# Altium footprint library biblioteka_pcb.PcbLib: 184 footprints (part 7 of 12)
Each footprint in its own frame and in the unit in brackets; x right, y up, seen from the top. Pads: shape width x height; smd on the part's side, far side on the other; paste and mask are expansions set on the pad; w line width, h text height; cw(c..) or ccw(c..) is an arc to the next point about the centre after c.
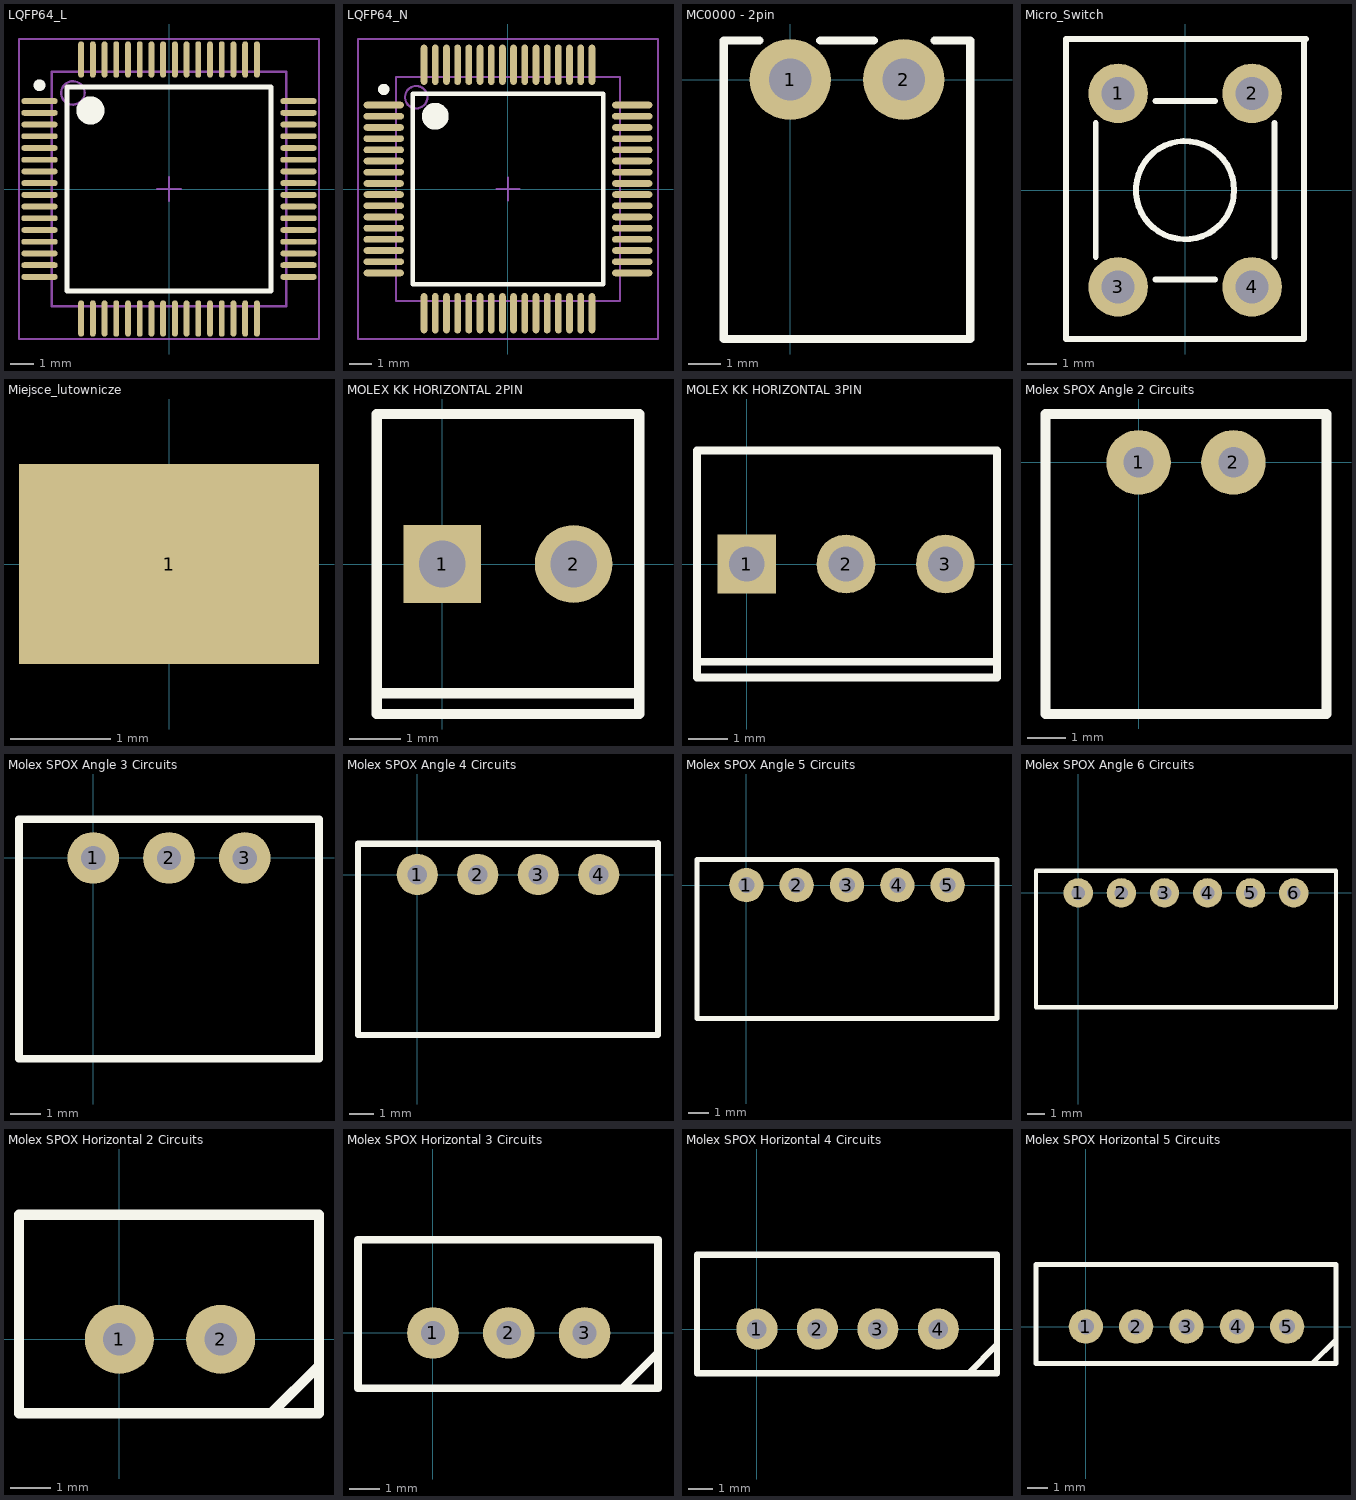
[diagram p6: the footprints below, top view; thin cyan lines are the x and y axes]

## LQFP64_L [mm] "Thin QFP, 64-Leads, Body 10x10mm, Pitch 0.5mm, IPC High Density"
height 1.6
pads (64):
  oval 1.55x0.25 smd: 1(-5.525,3.75) 2(-5.525,3.25) 3(-5.525,2.75) 4(-5.525,2.25) 5(-5.525,1.75) 6(-5.525,1.25) 7(-5.525,0.75) 8(-5.525,0.25) 9(-5.525,-0.25) 10(-5.525,-0.75) 11(-5.525,-1.25) 12(-5.525,-1.75) 13(-5.525,-2.25) 14(-5.525,-2.75) 15(-5.525,-3.25) 16(-5.525,-3.75) 33(5.525,-3.75) 34(5.525,-3.25) 35(5.525,-2.75) 36(5.525,-2.25) 37(5.525,-1.75) 38(5.525,-1.25) 39(5.525,-0.75) 40(5.525,-0.25) 41(5.525,0.25) 42(5.525,0.75) 43(5.525,1.25) 44(5.525,1.75) 45(5.525,2.25) 46(5.525,2.75) 47(5.525,3.25) 48(5.525,3.75)
  oval 0.25x1.55 smd: 17(-3.75,-5.525) 18(-3.25,-5.525) 19(-2.75,-5.525) 20(-2.25,-5.525) 21(-1.75,-5.525) 22(-1.25,-5.525) 23(-0.75,-5.525) 24(-0.25,-5.525) 25(0.25,-5.525) 26(0.75,-5.525) 27(1.25,-5.525) 28(1.75,-5.525) 29(2.25,-5.525) 30(2.75,-5.525) 31(3.25,-5.525) 32(3.75,-5.525) 49(3.75,5.525) 50(3.25,5.525) 51(2.75,5.525) 52(2.25,5.525) 53(1.75,5.525) 54(1.25,5.525) 55(0.75,5.525) 56(0.25,5.525) 57(-0.25,5.525) 58(-0.75,5.525) 59(-1.25,5.525) 60(-1.75,5.525) 61(-2.25,5.525) 62(-2.75,5.525) 63(-3.25,5.525) 64(-3.75,5.525)
Top Overlay:
  circle w0.6: c-3.35,3.35 r0.3
  circle w0.25: c-5.525,4.425 r0.125
  lines w0.2: -4.35,-4.35 4.35,-4.35 4.35,4.35 -4.35,4.35 -4.35,-4.35
Mechanical 13:
  circle w0.1: c-4.1,4.1 r0.5
  lines w0.1: -5,-5 5,-5 5,5 -5,5 -5,-5
Mechanical 15:
  lines w0.1: -0.5,0 0.5,0 ; 0,-0.5 0,0.5 ; -6.4,-6.4 6.4,-6.4 6.4,6.4 -6.4,6.4 -6.4,-6.4
3D body "LQFP64_L.stp": height 1.4, standoff 0, extent -6,-6 6,6

## LQFP64_N [mm] "Thin QFP, 64-Leads, Body 10x10mm, Pitch 0.5mm, IPC Medium Density"
height 1.6
pads (64):
  oval 1.8x0.3 smd: 1(-5.55,3.75) 2(-5.55,3.25) 3(-5.55,2.75) 4(-5.55,2.25) 5(-5.55,1.75) 6(-5.55,1.25) 7(-5.55,0.75) 8(-5.55,0.25) 9(-5.55,-0.25) 10(-5.55,-0.75) 11(-5.55,-1.25) 12(-5.55,-1.75) 13(-5.55,-2.25) 14(-5.55,-2.75) 15(-5.55,-3.25) 16(-5.55,-3.75) 33(5.55,-3.75) 34(5.55,-3.25) 35(5.55,-2.75) 36(5.55,-2.25) 37(5.55,-1.75) 38(5.55,-1.25) 39(5.55,-0.75) 40(5.55,-0.25) 41(5.55,0.25) 42(5.55,0.75) 43(5.55,1.25) 44(5.55,1.75) 45(5.55,2.25) 46(5.55,2.75) 47(5.55,3.25) 48(5.55,3.75)
  oval 0.3x1.8 smd: 17(-3.75,-5.55) 18(-3.25,-5.55) 19(-2.75,-5.55) 20(-2.25,-5.55) 21(-1.75,-5.55) 22(-1.25,-5.55) 23(-0.75,-5.55) 24(-0.25,-5.55) 25(0.25,-5.55) 26(0.75,-5.55) 27(1.25,-5.55) 28(1.75,-5.55) 29(2.25,-5.55) 30(2.75,-5.55) 31(3.25,-5.55) 32(3.75,-5.55) 49(3.75,5.55) 50(3.25,5.55) 51(2.75,5.55) 52(2.25,5.55) 53(1.75,5.55) 54(1.25,5.55) 55(0.75,5.55) 56(0.25,5.55) 57(-0.25,5.55) 58(-0.75,5.55) 59(-1.25,5.55) 60(-1.75,5.55) 61(-2.25,5.55) 62(-2.75,5.55) 63(-3.25,5.55) 64(-3.75,5.55)
Top Overlay:
  circle w0.6: c-3.25,3.25 r0.3
  circle w0.25: c-5.55,4.45 r0.125
  lines w0.2: -4.25,-4.25 4.25,-4.25 4.25,4.25 -4.25,4.25 -4.25,-4.25
Mechanical 13:
  circle w0.1: c-4.1,4.1 r0.5
  lines w0.1: -5,-5 5,-5 5,5 -5,5 -5,-5
Mechanical 15:
  lines w0.1: -0.5,0 0.5,0 ; 0,-0.5 0,0.5 ; -6.7,-6.7 6.7,-6.7 6.7,6.7 -6.7,6.7 -6.7,-6.7
3D body: height 1.6, standoff 0, extent -5,-5 5,5

## MC0000 - 2pin [mm]
pads (2):
  round 2.5 hole 1.3: 1(0,0) 2(3.5,0)
Top Overlay:
  lines w0.254: -0.95,1.2 -2.05,1.2 -2.05,-8 5.55,-8 5.55,1.2 4.45,1.2 ; 0.925,1.2 2.575,1.2

## Micro_Switch [mm] "Micro Switch with 2 leads used"
pads (4):
  round 2 hole 1.1: 1(-2.25,3.25) 2(2.25,3.25) 3(-2.25,-3.25) 4(2.25,-3.25)
Top Overlay:
  circle w0.2: c0,0 r1.65
  lines w0.2: -4,5.08 -4,-5 4,-5 4,5.08 ; -3.936,5.08 4.064,5.08 ; -3,-2.25 -3,2.25 ; -1,-3 1,-3 ; -1,3 1,3 ; 3,-2.25 3,2.25
3D body "Micro_Switch.stp": height 4.1, standoff 0, extent -3,-3.302 3,3.098

## Miejsce_lutownicze [mm]
pads (1):
  rect 3x2 smd: 1(0,0)

## MOLEX KK HORIZONTAL 2PIN [mm] "Connector; Header; 2 Position"
pads (2):
  rect 1.5x1.5 hole 0.9: 1(0,0)
  round 1.5 hole 0.9: 2(2.54,0)
Top Overlay:
  lines w0.2: -1.27,-2.5 3.81,-2.5 ; -1.27,-2.9 3.81,-2.9 3.81,2.9 -1.27,2.9 -1.27,-2.9

## MOLEX KK HORIZONTAL 3PIN [mm] "Connector; Header; 3 Position"
pads (3):
  rect 1.5x1.5 hole 0.9: 1(0,0)
  round 1.5 hole 0.9: 2(2.54,0) 3(5.08,0)
Top Overlay:
  lines w0.2: -1.27,-2.5 6.4,-2.5 ; -1.27,-2.9 6.4,-2.9 6.4,2.9 -1.27,2.9 -1.27,-2.9

## Molex SPOX Angle 2 Circuits [mm]
pads (2):
  round 1.7 hole 0.8: 1(0,0) 2(2.5,0)
Top Overlay:
  lines w0.254: -2.45,-6.625 -2.45,1.275 4.95,1.275 4.95,-6.625 -2.45,-6.625
3D body "022057025.stp": height 4.9, standoff -3.5, extent -2.45,-6.625 4.95,1.275

## Molex SPOX Angle 3 Circuits [mm]
pads (3):
  round 1.7 hole 0.8: 1(0,0) 2(2.5,0) 3(5,0)
Top Overlay:
  lines w0.254: -2.45,-6.625 -2.45,1.275 7.45,1.275 7.45,-6.625 -2.45,-6.625
3D body "022057035.stp": height 4.9, standoff -3.5, extent -2.45,-6.6 7.45,1.3

## Molex SPOX Angle 4 Circuits [mm]
pads (4):
  round 1.7 hole 0.8: 1(0,0) 2(2.5,0) 3(5,0) 4(7.5,0)
Top Overlay:
  lines w0.254: 9.95,1.275 -2.45,1.275 -2.45,-6.625 9.95,-6.625 9.95,1.3
3D body "022057045.stp": height 4.9, standoff -3.5, extent -2.45,-6.6 9.95,1.3

## Molex SPOX Angle 5 Circuits [mm]
pads (5):
  round 1.7 hole 0.8: 1(0,0) 2(2.5,0) 3(5,0) 4(7.5,0) 5(10,0)
Top Overlay:
  lines w0.254: -2.45,-6.625 -2.45,1.275 12.45,1.275 12.45,-6.625 -2.45,-6.625
3D body "022057055.stp": height 4.9, standoff -3.5, extent -2.45,-6.625 12.45,1.275

## Molex SPOX Angle 6 Circuits [mm]
pads (6):
  round 1.7 hole 0.8: 1(0,0) 2(2.5,0) 3(5,0) 4(7.5,0) 5(10,0) 6(12.5,0)
Top Overlay:
  lines w0.254: -2.45,-6.625 -2.45,1.275 14.95,1.275 14.95,-6.625 -2.45,-6.625
3D body "022057065.stp": height 4.9, standoff -3.5, extent -2.45,-6.625 14.95,1.275

## Molex SPOX Horizontal 2 Circuits [mm]
pads (2):
  round 1.7 hole 0.8: 1(0,0) 2(2.5,0)
Top Overlay:
  lines w0.254: 3.75,-1.825 4.9,-0.675 ; -2.475,-1.825 -2.475,3.075 4.925,3.075 4.925,-1.825 -2.475,-1.825
3D body "022035025.stp": height 5.9, standoff -3.5, extent -2.475,-1.825 4.925,3.075

## Molex SPOX Horizontal 3 Circuits [mm]
pads (3):
  round 1.7 hole 0.8: 1(0,0) 2(2.5,0) 3(5,0)
Top Overlay:
  lines w0.254: 6.25,-1.825 7.4,-0.675 ; -2.475,-1.825 -2.475,3.075 7.425,3.075 7.425,-1.825 -2.475,-1.825
3D body "022035035.stp": height 5.9, standoff -3.5, extent -2.475,-1.825 7.425,3.075

## Molex SPOX Horizontal 4 Circuits [mm]
pads (4):
  round 1.7 hole 0.8: 1(0,0) 2(2.5,0) 3(5,0) 4(7.5,0)
Top Overlay:
  lines w0.254: 8.75,-1.825 9.9,-0.675 ; -2.475,-1.825 9.925,-1.825 9.925,3.075 -2.475,3.075 -2.475,-1.825
3D body "022035045.stp": height 5.9, standoff -3.5, extent -2.475,-1.825 9.925,3.075

## Molex SPOX Horizontal 5 Circuits [mm]
pads (5):
  round 1.7 hole 0.8: 1(0,0) 2(2.5,0) 3(5,0) 4(7.5,0) 5(10,0)
Top Overlay:
  lines w0.254: 11.25,-1.825 12.4,-0.675 ; -2.475,-1.825 -2.475,3.075 12.425,3.075 12.425,-1.825 -2.475,-1.825
3D body "022035055.stp": height 5.9, standoff -3.5, extent -2.475,-1.825 12.425,3.075